# Altium footprint library Lib_001.PcbLib: 429 footprints (part 3 of 28)
Each footprint in its own frame and in the unit in brackets; x right, y up, seen from the top. Pads: shape width x height; smd on the part's side, far side on the other; paste and mask are expansions set on the pad; w line width, h text height; cw(c..) or ccw(c..) is an arc to the next point about the centre after c.
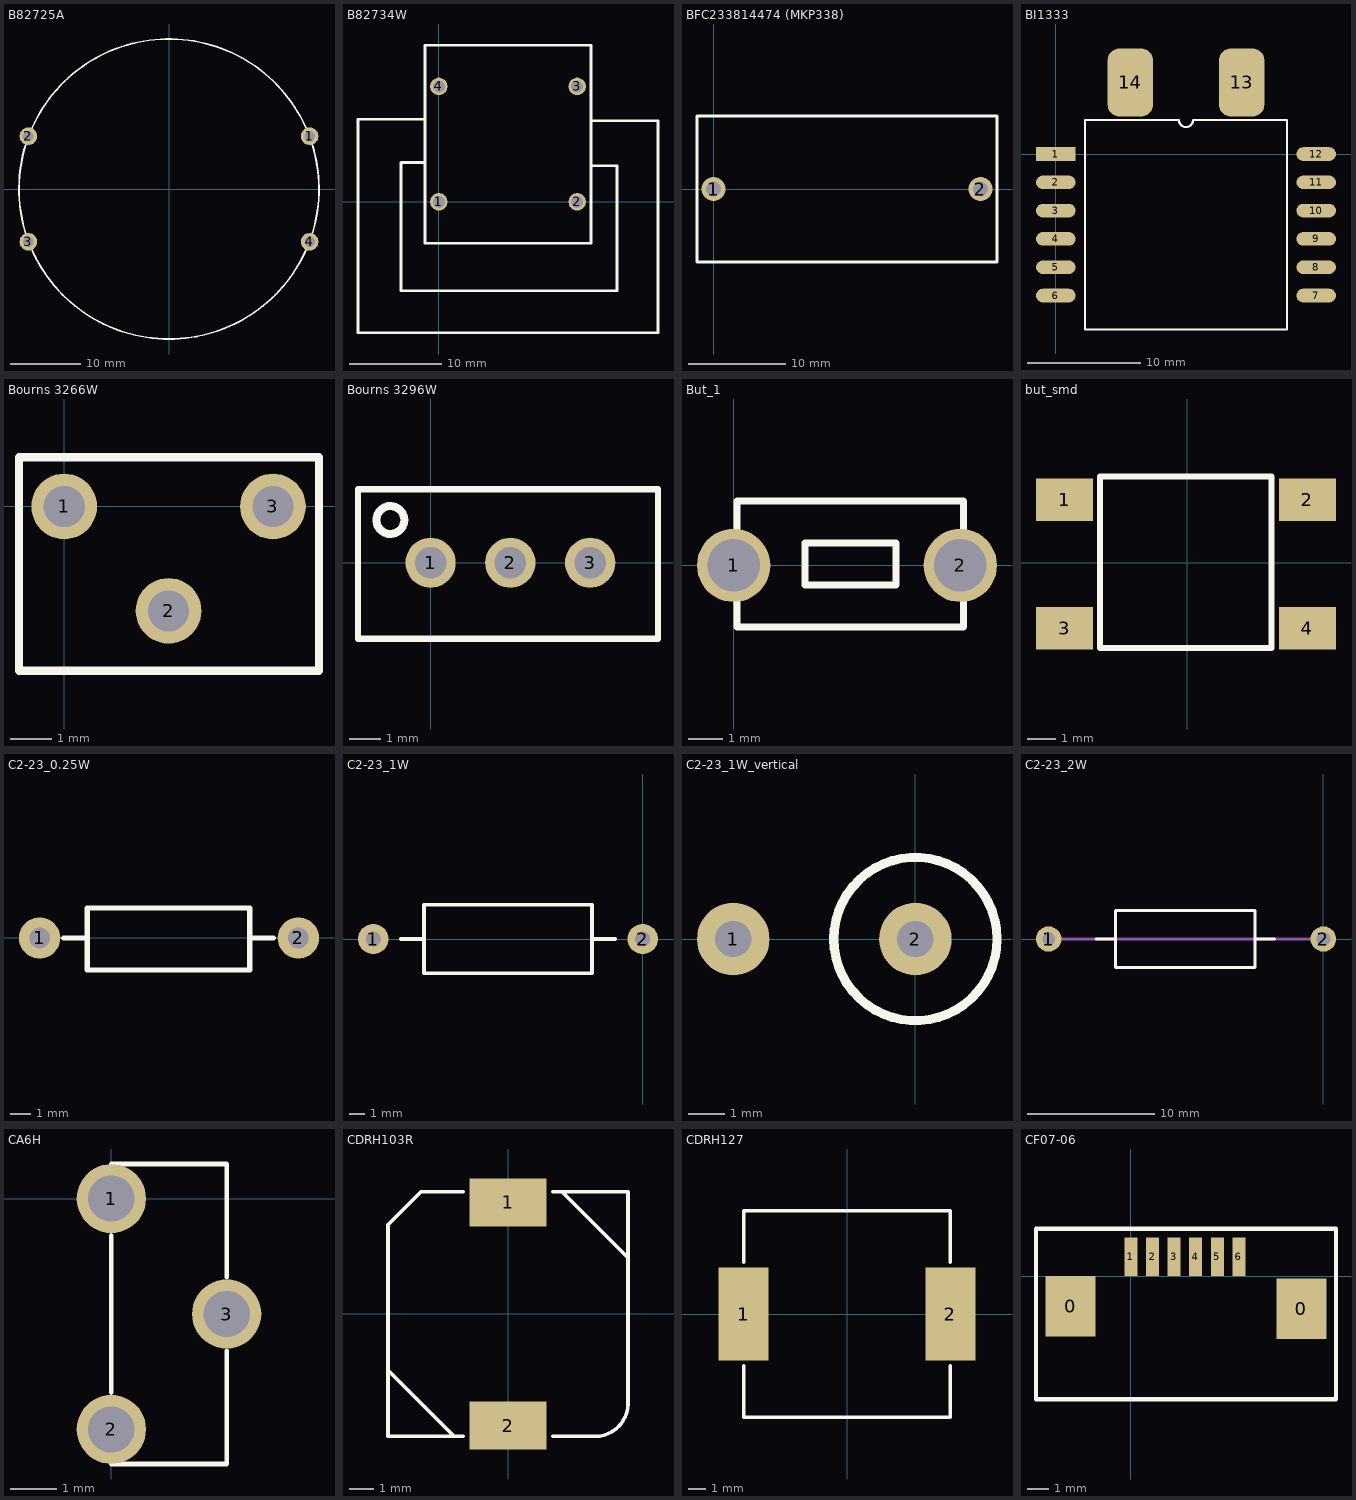
[diagram p2: the footprints below, top view; thin cyan lines are the x and y axes]

## B82725A [mm]
pads (4):
  round 2.5 hole 1.5: 1(20,7.5) 2(-20,7.5) 3(-20,-7.5) 4(20,-7.5)
Top Overlay:
  lines w0.254: 21.324,0.18 cw(c0,0) 21.323,0.226
3D body "User Library-B82725A.step": height 25, standoff -3.5, extent -21.981,-21.193 22.019,21.207

## B82734W [mm]
pads (4):
  round 1.9 hole 1.3: 1(0,0) 2(15,0) 3(15,12.5) 4(0,12.5)
Top Overlay:
  lines w0.3: -1.52,4.27 -4.1,4.27 -4.1,-9.64 19.3,-9.64 19.3,3.91 16.53,3.91 ; -1.52,8.95 -8.75,8.95 -8.75,-14.2 23.75,-14.2 23.75,8.79 16.53,8.79 ; -1.5,-4.49 -1.5,16.97 16.5,16.97 16.5,-4.49 -1.5,-4.49

## BFC233814474 (MKP338) [mm] "Interference Suppression Film Capacitor"
pads (2):
  round 2.5 hole 1.5: 1(0,0) 2(27.5,0)
Top Overlay:
  lines w0.3: -1.7,-7.49 -1.7,0 -1.7,7.5 ; -1.69,-7.5 0,-7.5 29.2,-7.5 ; -1.69,7.5 0,7.5 29.2,7.5 ; 29.2,-7.46 29.2,0 29.2,7.49
3D body: height 25, standoff 0, extent -1.69,-7.5 29.2,7.5

## BI1333 [mm]
pads (14):
  rect 3.5x1.2 smd: 1(0,0)
  oval 3.5x1.2 smd: 2(0,-2.5) 3(0,-5) 4(0,-7.5) 5(0,-10) 6(0,-12.5) 7(23,-12.5) 8(23,-10) 9(23,-7.5) 10(23,-5) 11(23,-2.5) 12(23,0)
  rrect50% 4x6 smd: 13(16.42,6.32) 14(6.58,6.32)
Top Overlay:
  lines w0.2: 2.585,-15.5 20.415,-15.5 20.415,3 12.125,3 cw(c11.5,3) 10.875,3 2.585,3 2.585,-15.5
3D body: height 10, standoff 0, extent 2.585,-15.5 20.415,3

## Bourns 3266W [mm] "Подстроечный резистор"
pads (3):
  round 1.6 hole 1: 1(0,0) 2(2.54,-2.54) 3(5.08,0)
Top Overlay:
  lines w0.2: -1.1,-4 -1.1,1.2 6.2,1.2 6.2,-4 -1.1,-4
3D body "User Library-POT-3266W.STEP": height 8.25, standoff -1.91, extent -0.843,-3.466 5.863,1.03

## Bourns 3296W [mm]
pads (3):
  round 1.6 hole 1: 1(0,0) 2(2.54,0) 3(5.08,0)
Top Overlay:
  circle w0.254: c-1.28,1.36 r0.444
  lines w0.2: -2.31,-2.42 -2.31,2.34 7.24,2.34 7.24,-2.42 -2.31,-2.42
3D body "User Library-3296W.step": height 11.55, standoff -1.6, extent -2.305,-2.41 7.225,2.39

## But_1 [mm]
pads (2):
  round 2.1 hole 1.5: 1(0,0) 2(6.5,0)
Top Overlay:
  lines w0.2: 0.09,-1.76 0.09,0.04 0.09,1.84 6.583,1.84 6.583,-0.553 6.583,-1.76 0.09,-1.76 ; 2.05,-0.56 2.05,0.64 2.55,0.64 4.65,0.64 4.65,0.44 4.65,-0.56 2.05,-0.56
3D body "User Library-DTS-32.STEP": height 5.1, standoff -3.41, extent -0.666,-1.74 7.09,1.76

## but_smd [mm]
pads (4):
  rect 2x1.5 smd: 1(-4.287,2.215) 2(4.213,2.215) 3(-4.287,-2.285) 4(4.213,-2.285)
Top Overlay:
  lines w0.2: -3.047,-2.975 2.953,-2.975 2.953,3.025 -3.047,3.025 -3.047,-2.975
3D body "User Library-KFC-A06-HA-4_3.STEP": height 4.3, standoff 0, extent -4.547,-2.975 4.453,3.025

## C2-23_0.25W [mm]
pads (2):
  round 2 hole 1: 1(-15.3,0) 2(-2.8,0)
Top Overlay:
  lines w0.254: -14.15,0 -13,0 ; -5.15,0 -4,0 ; -13,0 -13,-1.34 -13,-1.55 -5.15,-1.55 -5.15,-0.15 -5.15,1.45 -13,1.45 -13,0
3D body "User Library-RES0_25L12_5.STEP": height 3.5, standoff -2.5, extent -15.6,-1.55 -2.5,1.45

## C2-23_1W [mm]
pads (2):
  round 2 hole 1: 1(-17.68,0) 2(0,0)
Top Overlay:
  lines w0.254: -15.86,0 -14.34,0 ; -1.82,0 -3.34,0 ; -14.34,0 -14.34,2.25 -3.34,2.25 -3.34,0 ; -14.34,0 -14.34,-2.25 -3.34,-2.25 -3.34,0
3D body "User Library-C2-23-1W.step": height 5.25, standoff -2, extent -17.98,-2.19 0.6,2.31

## C2-23_1W_vertical [mm]
pads (2):
  round 2 hole 1: 1(-5.02,0) 2(0,0)
Top Overlay:
  circle w0.254: c0,0 r2.25
3D body "User Library-Axial Resistor-Vertical(2).step": height 13.92, standoff -1.91, extent -5.483,-2.15 2.163,2.168

## C2-23_2W [mm]
pads (2):
  round 2 hole 1: 1(-21.66,0)
  round 2 hole 1.1: 2(0,0)
Top Overlay:
  lines w0.254: -17.9,0 -16.38,0 ; -3.86,0 -5.38,0 ; -16.38,0 -16.38,-2.25 -5.38,-2.25 -5.38,0 ; -16.38,0 -16.38,2.25 -5.38,2.25 -5.38,0
Mechanical 1:
  lines w0.254: -21.66,0 -18.33,0 -3.33,0 0,0
3D body "User Library-RESAD2250W80L1600D500_2W.STEP": height 5.5, standoff -2.5, extent -22.24,-2.42 1.06,2.58

## CA6H [mm]
height 6.5
pads (3):
  round 1.5 hole 1: 1(0,0) 2(0,-5) 3(2.5,-2.5)
Top Overlay:
  lines w0.1: 0,-5.75 2.5,-5.75 2.5,-3.3 ; 0,-4.2 0,-0.8 ; 0,0.75 2.5,0.75 2.5,-1.7
3D body: height 6.5, standoff 0, extent 0,-5.75 2.5,0.75
3D body: height 3, standoff -3, extent -0.2,-0.35 0.2,0.35
3D body: height 3, standoff -3, extent -0.2,-5.35 0.2,-4.65
3D body: height 1.5, standoff -3, extent 2.3,-2.85 2.7,-2.15

## CDRH103R [mm] "POWER INDUCTORS"
height 2.8
pads (2):
  rect 3.2x2 smd: 1(0,4.65) 2(0,-4.65)
Top Overlay:
  lines w0.15: -5,-2.35 -2.25,-5.1 ; -1.876,5.1 -3.625,5.1 -5,3.725 -5,-5.1 -1.875,-5.1 -1.875,-5.1 ; 1.875,-5.1 1.875,-5.1 3.625,-5.1 ccw(c3.625,-3.725) 5,-3.725 5,5.1 1.875,5.1 ; 2.25,5.1 5,2.35

## CDRH127 [mm] "POWER INDUCTOR CDRH127"
height 8
pads (2):
  rect 2.9x5.4 smd: 1(-6,0) 2(6,0)
Top Overlay:
  lines w0.2: -6,-3 -6,-6 6,-6 6,-3 ; -6,3 -6,6 6,6 6,3
3D body "User Library-CDRH127-2.step": height 8, standoff 0, extent -5.8,-6.13 6.2,5.87

## CF07-06 [mm]
pads (8):
  rect 2.3x2.8 smd paste+0 mask+0.1: 0(-2.8,-1.4) 0(7.9,-1.5)
  rect 0.6x1.8 smd paste+0 mask+0.1: 1(0,0.9) 2(1,0.9) 3(2,0.9) 4(3,0.9) 5(4,0.9) 6(5,0.9)
Top Overlay:
  lines w0.2: -4.4,-5.7 -4.4,2.2 9.5,2.2 9.5,-5.7 -4.4,-5.7
3D body: height 2, standoff 0, extent -3.9,-5.3 9,1.8